# Altium footprint library PcbLibLafe.PcbLib: 297 footprints (part 15 of 19)
Each footprint in its own frame and in the unit in brackets; x right, y up, seen from the top. Pads: shape width x height; smd on the part's side, far side on the other; paste and mask are expansions set on the pad; w line width, h text height; cw(c..) or ccw(c..) is an arc to the next point about the centre after c.
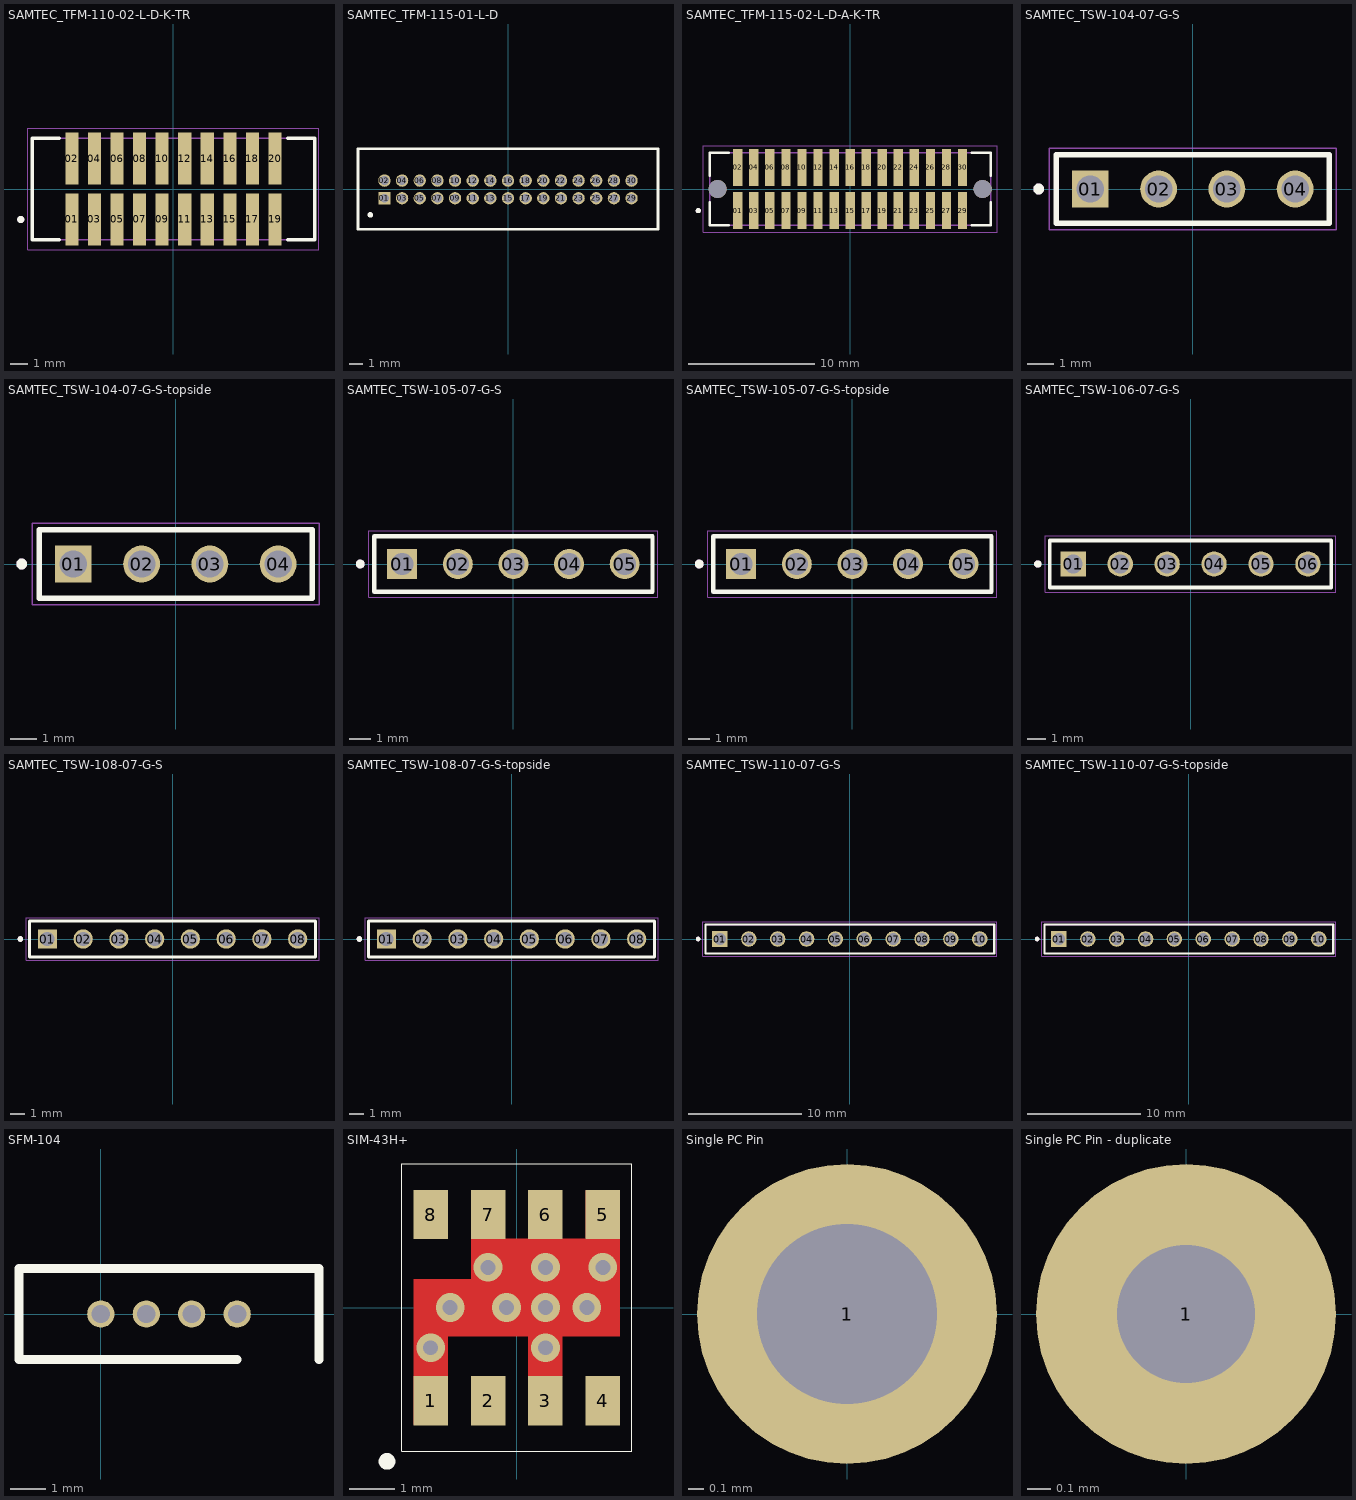
[diagram p14: the footprints below, top view; thin cyan lines are the x and y axes]

## SAMTEC_TFM-110-02-L-D-K-TR [mm]
pads (20):
  rect 0.74x2.92 smd: 01(-5.715,-1.715) 02(-5.715,1.715) 03(-4.445,-1.715) 04(-4.445,1.715) 05(-3.175,-1.715) 06(-3.175,1.715) 07(-1.905,-1.715) 08(-1.905,1.715) 09(-0.635,-1.715) 10(-0.635,1.715) 11(0.635,-1.715) 12(0.635,1.715) 13(1.905,-1.715) 14(1.905,1.715) 15(3.175,-1.715) 16(3.175,1.715) 17(4.445,-1.715) 18(4.445,1.715) 19(5.715,-1.715) 20(5.715,1.715)
Top Overlay:
  circle w0.2: c-8.59,-1.715 r0.1
  lines w0.2: -6.435,-2.86 -7.94,-2.86 -7.94,2.86 -6.435,2.86 ; 6.435,-2.86 7.94,-2.86 7.94,2.86 6.435,2.86
Mechanical 13:
  circle w0.2: c-8.59,-1.715 r0.1
  lines w0.1: -7.94,-2.86 -7.94,2.86 ; -7.94,-2.86 7.94,-2.86 ; -7.94,-2.86 -7.94,2.86 ; -7.94,2.86 7.94,2.86 ; -7.94,2.86 7.94,2.86 ; 7.94,-2.86 7.94,2.86 ; 7.94,-2.86 7.94,2.86
Mechanical 15:
  lines w0.05: -8.19,-3.425 -8.19,3.425 8.19,3.425 8.19,-3.425 -8.19,-3.425
3D body "TFM-110-02-L-D-K-TR.stp": height 5.81, standoff -0.05, extent -7.963,-2.975 7.912,2.994

## SAMTEC_TFM-115-01-L-D [mil]
pads (30):
  rect 35x35 hole 25: 01(-350,-25)
  round 35 hole 25: 02(-350,25) 03(-300,-25) 04(-300,25) 05(-250,-25) 06(-250,25) 07(-200,-25) 08(-200,25) 09(-150,-25) 10(-150,25) 11(-100,-25) 12(-100,25) 13(-50,-25) 14(-50,25) 15(0,-25) 16(0,25) 17(50,-25) 18(50,25) 19(100,-25) 20(100,25) 21(150,-25) 22(150,25) 23(200,-25) 24(200,25) 25(250,-25) 26(250,25) 27(300,-25) 28(300,25) 29(350,-25) 30(350,25)
Top Overlay:
  circle w7.87: c-390,-72 r3.94
  lines w7.87: 425,112.6 425,-112.6 -425,-112.6 -425,115 425,115
3D body "TFM-115-01-L-D.stp": height 220, standoff -78, extent -437.5,-122 437.5,103

## SAMTEC_TFM-115-02-L-D-A-K-TR [mm]
pads (32):
  rect 0.74x2.92 smd: 01(-8.89,-1.715) 02(-8.89,1.715) 03(-7.62,-1.715) 04(-7.62,1.715) 05(-6.35,-1.715) 06(-6.35,1.715) 07(-5.08,-1.715) 08(-5.08,1.715) 09(-3.81,-1.715) 10(-3.81,1.715) 11(-2.54,-1.715) 12(-2.54,1.715) 13(-1.27,-1.715) 14(-1.27,1.715) 15(0,-1.715) 16(0,1.715) 17(1.27,-1.715) 18(1.27,1.715) 19(2.54,-1.715) 20(2.54,1.715) 21(3.81,-1.715) 22(3.81,1.715) 23(5.08,-1.715) 24(5.08,1.715) 25(6.35,-1.715) 26(6.35,1.715) 27(7.62,-1.715) 28(7.62,1.715) 29(8.89,-1.715) 30(8.89,1.715)
  round 1.42 hole 1.42 unplated: ""(-10.48,0) ""(10.48,0)
Top Overlay:
  circle w0.2: c-12.015,-1.715 r0.1
  lines w0.2: -11.115,-1.064 -11.115,-2.86 -9.61,-2.86 ; -11.115,1.064 -11.115,2.86 -9.61,2.86 ; 9.61,-2.86 11.115,-2.86 11.115,-1.064 ; 9.61,2.86 11.115,2.86 11.115,1.064
Mechanical 13:
  circle w0.2: c-12.015,-1.715 r0.1
  lines w0.1: -11.115,-2.86 -11.115,2.86 ; -11.115,-2.86 11.115,-2.86 ; -11.115,-2.86 -11.115,2.86 ; -11.115,2.86 11.115,2.86 ; -11.115,2.86 11.115,2.86 ; 11.115,-2.86 11.115,2.86 ; 11.115,-2.86 11.115,2.86
Mechanical 15:
  lines w0.05: -11.615,-3.425 -11.615,3.425 11.615,3.425 11.615,-3.425 -11.615,-3.425
3D body "TFM-115-02-L-D-A-K-TR.step": height 5.71, standoff -1.14, extent -11.112,-2.984 11.112,2.984

## SAMTEC_TSW-104-07-G-S [mm]
pads (4):
  rect 1.37x1.37 / inner round 1.37 / far side rect 1.37x1.37 hole 1.02: 01(-3.81,0)
  round 1.37 hole 1.02: 02(-1.27,0) 03(1.27,0) 04(3.81,0)
Top Overlay:
  circle w0.2: c-5.73,0 r0.1
  lines w0.2: -5.08,-1.27 5.08,-1.27 5.08,1.27 -5.08,1.27 -5.08,-1.27
Mechanical 13:
  circle w0.2: c-5.73,0 r0.1
  lines w0.1: -5.08,-1.27 -5.08,1.27 ; -5.08,-1.27 5.08,-1.27 ; -5.08,-1.27 -5.08,1.27 ; -5.08,1.27 5.08,1.27 ; -5.08,1.27 5.08,1.27 ; 5.08,-1.27 5.08,1.27 ; 5.08,-1.27 5.08,1.27
Mechanical 15:
  lines w0.05: -5.33,-1.52 5.33,-1.52 5.33,1.52 -5.33,1.52 -5.33,-1.52

## SAMTEC_TSW-104-07-G-S-topside [mm]
pads (4):
  rect 1.37x1.37 / inner round 1.37 / far side rect 1.37x1.37 hole 1.02: 01(-3.81,0)
  round 1.37 hole 1.02: 02(-1.27,0) 03(1.27,0) 04(3.81,0)
Top Overlay:
  circle w0.2: c-5.73,0 r0.1
  lines w0.2: -5.08,-1.27 -5.08,1.27 5.08,1.27 5.08,-1.27 -5.08,-1.27
Mechanical 13:
  circle w0.2: c-5.73,0 r0.1
  lines w0.1: -5.08,-1.27 -5.08,1.27 ; -5.08,-1.27 5.08,-1.27 ; -5.08,-1.27 -5.08,1.27 ; -5.08,1.27 5.08,1.27 ; -5.08,1.27 5.08,1.27 ; 5.08,-1.27 5.08,1.27 ; 5.08,-1.27 5.08,1.27
Mechanical 15:
  lines w0.05: -5.33,-1.52 -5.33,1.52 5.33,1.52 5.33,-1.52 -5.33,-1.52
3D body "TSW-104-07-G-S.stp": height 8.38, standoff -2.54, extent -5.207,-1.27 5.08,1.27

## SAMTEC_TSW-105-07-G-S [mm]
pads (5):
  rect 1.37x1.37 hole 1.02: 01(-5.08,0)
  round 1.37 hole 1.02: 02(-2.54,0) 03(0,0) 04(2.54,0) 05(5.08,0)
Top Overlay:
  circle w0.2: c-7,0 r0.1
  lines w0.2: -6.35,-1.27 -6.35,1.27 6.35,1.27 6.35,-1.27 -6.35,-1.27
Mechanical 13:
  circle w0.2: c-7,0 r0.1
  lines w0.1: -6.35,-1.27 -6.35,1.27 ; -6.35,-1.27 6.35,-1.27 ; -6.35,-1.27 -6.35,1.27 ; -6.35,1.27 6.35,1.27 ; -6.35,1.27 6.35,1.27 ; 6.35,-1.27 6.35,1.27 ; 6.35,-1.27 6.35,1.27
Mechanical 15:
  lines w0.05: -6.6,-1.52 -6.6,1.52 6.6,1.52 6.6,-1.52 -6.6,-1.52
3D body "TSW-105-07-G-S.stp": height 1.44, standoff -9.48, extent -6.477,-1.27 6.35,1.27

## SAMTEC_TSW-105-07-G-S-topside [mm]
pads (5):
  rect 1.37x1.37 hole 1.02: 01(-5.08,0)
  round 1.37 hole 1.02: 02(-2.54,0) 03(0,0) 04(2.54,0) 05(5.08,0)
Top Overlay:
  circle w0.2: c-7,0 r0.1
  lines w0.2: -6.35,-1.27 6.35,-1.27 6.35,1.27 -6.35,1.27 -6.35,-1.27
Mechanical 13:
  circle w0.2: c-7,0 r0.1
  lines w0.1: -6.35,-1.27 -6.35,1.27 ; -6.35,-1.27 6.35,-1.27 ; -6.35,-1.27 -6.35,1.27 ; -6.35,1.27 6.35,1.27 ; -6.35,1.27 6.35,1.27 ; 6.35,-1.27 6.35,1.27 ; 6.35,-1.27 6.35,1.27
Mechanical 15:
  lines w0.05: -6.6,-1.52 6.6,-1.52 6.6,1.52 -6.6,1.52 -6.6,-1.52
3D body "TSW-105-07-G-S.stp": height 5.9, standoff -2.61, extent -6.477,-1.27 6.35,1.27

## SAMTEC_TSW-106-07-G-S [mm]
pads (6):
  rect 1.37x1.37 hole 1.02: 01(-6.35,0)
  round 1.37 hole 1.02: 02(-3.81,0) 03(-1.27,0) 04(1.27,0) 05(3.81,0) 06(6.35,0)
Top Overlay:
  circle w0.2: c-8.27,0 r0.1
  lines w0.2: -7.62,-1.27 7.62,-1.27 7.62,1.27 -7.62,1.27 -7.62,-1.27
Mechanical 13:
  circle w0.2: c-8.27,0 r0.1
  lines w0.1: -7.62,-1.27 -7.62,1.27 ; -7.62,-1.27 7.62,-1.27 ; -7.62,-1.27 -7.62,1.27 ; -7.62,1.27 7.62,1.27 ; -7.62,1.27 7.62,1.27 ; 7.62,-1.27 7.62,1.27 ; 7.62,-1.27 7.62,1.27
Mechanical 15:
  lines w0.05: -7.87,-1.52 7.87,-1.52 7.87,1.52 -7.87,1.52 -7.87,-1.52
3D body "TSW-106-07-G-S.stp": height 1.34, standoff -9.58, extent -7.683,-1.315 7.683,1.225

## SAMTEC_TSW-108-07-G-S [mm]
pads (8):
  rect 1.37x1.37 / inner round 1.37 / far side rect 1.37x1.37 hole 1.02: 01(-8.89,0)
  round 1.37 hole 1.02: 02(-6.35,0) 03(-3.81,0) 04(-1.27,0) 05(1.27,0) 06(3.81,0) 07(6.35,0) 08(8.89,0)
Top Overlay:
  circle w0.2: c-10.81,0 r0.1
  lines w0.2: -10.16,-1.27 -10.16,1.27 10.16,1.27 10.16,-1.27 -10.16,-1.27
Mechanical 13:
  circle w0.2: c-10.81,0 r0.1
  lines w0.1: -10.16,-1.27 -10.16,1.27 ; -10.16,-1.27 10.16,-1.27 ; -10.16,-1.27 -10.16,1.27 ; -10.16,1.27 10.16,1.27 ; -10.16,1.27 10.16,1.27 ; 10.16,-1.27 10.16,1.27 ; 10.16,-1.27 10.16,1.27
Mechanical 15:
  lines w0.05: -10.41,-1.52 -10.41,1.52 10.41,1.52 10.41,-1.52 -10.41,-1.52
3D body "TSW-108-07-G-S.stp": height 1.34, standoff -9.58, extent -10.249,-1.34 10.198,1.2

## SAMTEC_TSW-108-07-G-S-topside [mm]
pads (8):
  rect 1.37x1.37 / inner round 1.37 / far side rect 1.37x1.37 hole 1.02: 01(-8.89,0)
  round 1.37 hole 1.02: 02(-6.35,0) 03(-3.81,0) 04(-1.27,0) 05(1.27,0) 06(3.81,0) 07(6.35,0) 08(8.89,0)
Top Overlay:
  circle w0.2: c-10.81,0 r0.1
  lines w0.2: -10.16,-1.27 10.16,-1.27 10.16,1.27 -10.16,1.27 -10.16,-1.27
Mechanical 13:
  circle w0.2: c-10.81,0 r0.1
  lines w0.1: -10.16,-1.27 -10.16,1.27 ; -10.16,-1.27 10.16,-1.27 ; -10.16,-1.27 -10.16,1.27 ; -10.16,1.27 10.16,1.27 ; -10.16,1.27 10.16,1.27 ; 10.16,-1.27 10.16,1.27 ; 10.16,-1.27 10.16,1.27
Mechanical 15:
  lines w0.05: -10.41,-1.52 10.41,-1.52 10.41,1.52 -10.41,1.52 -10.41,-1.52
3D body "TSW-108-07-G-S.stp": height 8.38, standoff -2.54, extent -10.249,-1.34 10.198,1.2

## SAMTEC_TSW-110-07-G-S [mm]
pads (10):
  rect 1.37x1.37 / inner round 1.37 / far side rect 1.37x1.37 hole 1.02: 01(-11.43,0)
  round 1.37 hole 1.02: 02(-8.89,0) 03(-6.35,0) 04(-3.81,0) 05(-1.27,0) 06(1.27,0) 07(3.81,0) 08(6.35,0) 09(8.89,0) 10(11.43,0)
Top Overlay:
  circle w0.2: c-13.35,0 r0.1
  lines w0.2: -12.7,-1.27 12.7,-1.27 12.7,1.27 -12.7,1.27 -12.7,-1.27
Mechanical 13:
  circle w0.2: c-13.35,0 r0.1
  lines w0.1: -12.7,-1.27 -12.7,1.27 ; -12.7,-1.27 12.7,-1.27 ; -12.7,-1.27 -12.7,1.27 ; -12.7,1.27 12.7,1.27 ; -12.7,1.27 12.7,1.27 ; 12.7,-1.27 12.7,1.27 ; 12.7,-1.27 12.7,1.27
Mechanical 15:
  lines w0.05: -12.95,-1.52 12.95,-1.52 12.95,1.52 -12.95,1.52 -12.95,-1.52
3D body "TSW-110-07-G-S.stp": height 1.34, standoff -9.58, extent -12.752,-1.295 12.775,1.245

## SAMTEC_TSW-110-07-G-S-topside [mm]
pads (10):
  rect 1.37x1.37 / inner round 1.37 / far side rect 1.37x1.37 hole 1.02: 01(-11.43,0)
  round 1.37 hole 1.02: 02(-8.89,0) 03(-6.35,0) 04(-3.81,0) 05(-1.27,0) 06(1.27,0) 07(3.81,0) 08(6.35,0) 09(8.89,0) 10(11.43,0)
Top Overlay:
  circle w0.2: c-13.35,0 r0.1
  lines w0.2: -12.7,-1.27 -12.7,1.27 12.7,1.27 12.7,-1.27 -12.7,-1.27
Mechanical 13:
  circle w0.2: c-13.35,0 r0.1
  lines w0.1: -12.7,-1.27 -12.7,1.27 ; -12.7,-1.27 12.7,-1.27 ; -12.7,-1.27 -12.7,1.27 ; -12.7,1.27 12.7,1.27 ; -12.7,1.27 12.7,1.27 ; 12.7,-1.27 12.7,1.27 ; 12.7,-1.27 12.7,1.27
Mechanical 15:
  lines w0.05: -12.95,-1.52 -12.95,1.52 12.95,1.52 12.95,-1.52 -12.95,-1.52
3D body "TSW-110-07-G-S.stp": height 8.38, standoff -2.54, extent -12.752,-1.295 12.775,1.245

## SFM-104 [mil] "Samtec 4 pin thru hole"
pads (4):
  round 30 hole 20: ""(0,0) ""(50,0) ""(100,0) ""(150,0)
Top Overlay:
  lines w10: 150,-50 -90,-50 -90,50 240,50 240,-50

## SIM-43H+ [mil]
pads (8):
  rect 30x43 smd: 1(-75,-81) 2(-25,-81) 3(25,-81) 4(75,-81) 5(75,81) 6(25,81) 7(-25,81) 8(-75,81)
via -25,35 diameter 25 hole 13
via 25,35 diameter 25 hole 13
via 75,35 diameter 25 hole 13
via 25,0 diameter 25 hole 13
via 61,0 diameter 25 hole 13
via -9,0 diameter 25 hole 13
via 25,-35 diameter 25 hole 13
via -75,-35 diameter 25 hole 13
via -58,0 diameter 25 hole 13
Top Layer:
  rectangle: -40,14 89,60
  rectangle: -90,-25 90,25
  rectangle: 10,-60 40,-23
  rectangle: 60,-25 90,102
  rectangle: -90,-102 -60,25
Top Overlay:
  circle w10: c-113,-134 r2.24
  lines w1: -100,-125 100,-125 100,125 -100,125 -100,-125
Top Solder:
  rectangle: -90,-16 -75,25
  rectangle: -90,12 -25,25
  rectangle: -39,-25 -25,17
  rectangle: -39,-25 10,-14
  rectangle: 40,-25 90,-12
  rectangle: 75,-14 90,22

## Single PC Pin [mil]
pads (1):
  round 75 hole 45: 1(0,0)

## Single PC Pin - duplicate [mil]
pads (1):
  round 50 hole 23: 1(0,0)